# Altium footprint library Radio Lib.PcbLib: 41 footprints (part 1 of 3)
Each footprint in its own frame and in the unit in brackets; x right, y up, seen from the top. Pads: shape width x height; smd on the part's side, far side on the other; paste and mask are expansions set on the pad; w line width, h text height; cw(c..) or ccw(c..) is an arc to the next point about the centre after c.
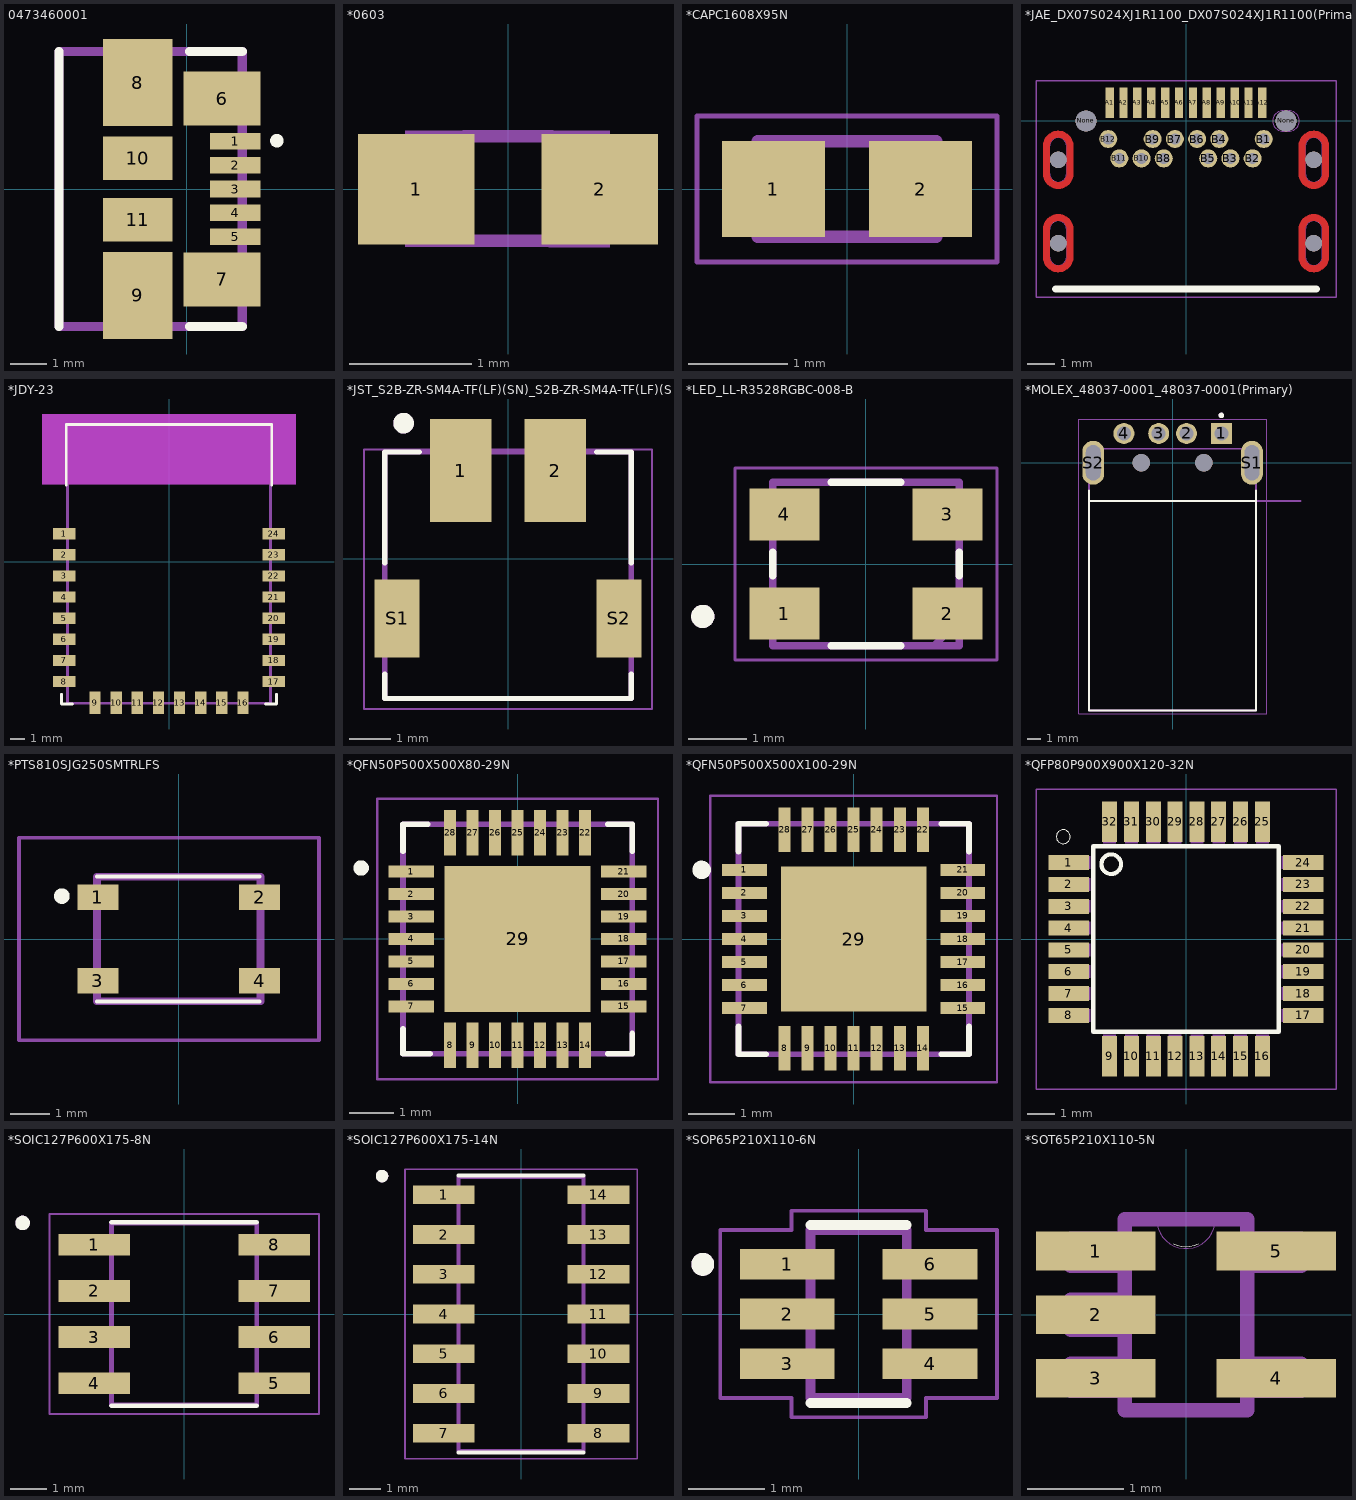
[diagram p0: the footprints below, top view; thin cyan lines are the x and y axes]

## 0473460001 [mm]
pads (11):
  rect 1.38x0.45 smd: 1(1.33,1.3) 2(1.33,0.65) 3(1.33,0) 4(1.33,-0.65) 5(1.33,-1.3)
  rect 2.1x1.475 smd: 6(0.97,2.462) 7(0.97,-2.462)
  rect 1.9x2.375 smd: 8(-1.33,2.903) 9(-1.33,-2.903)
  rect 1.9x1.175 smd: 10(-1.33,0.837) 11(-1.33,-0.837)
Top Overlay:
  circle w0.254: c2.46,1.317 r0.057
  lines w0.254: -3.48,-3.75 -3.48,3.75 ; 0.076,-3.75 1.52,-3.75 ; 0.076,3.75 1.52,3.75
Mechanical 4:
  lines w0.254: -3.48,-3.75 1.52,-3.75 1.52,3.75 -3.48,3.75 -3.48,-3.75
3D body "473460001.STEP": height 2.73, standoff -0.22, extent -3.449,-4.015 1.981,3.965

## *0603 [mm]
pads (2):
  rect 0.95x0.9 smd: 1(-0.75,0) 2(0.75,0)
Mechanical 4:
  region: -0.84,0.48 -0.338,0.48 -0.338,-0.471 -0.84,-0.471
  region: 0.331,0.48 0.83,0.48 0.83,-0.471 0.331,-0.471
  region: -0.84,0.48 -0.338,0.48 -0.338,-0.471 -0.84,-0.471
  region: 0.331,0.48 0.83,0.48 0.83,-0.471 0.331,-0.471
  lines w0.102: -0.356,-0.419 0.356,-0.419 -0.356,-0.419 ; -0.356,0.432 0.356,0.432 -0.356,0.432
3D body "LED SMD 0603.step": height 0.6, standoff 0, extent -0.8,-0.4 0.8,0.4

## *CAPC1608X95N [mm]
pads (2):
  rect 1.04x0.97 smd: 1(-0.74,0) 2(0.74,0)
Mechanical 4:
  lines w0.127: -0.9,-0.48 -0.9,0.48 ; -0.9,-0.48 0.9,-0.48 ; -0.9,-0.48 -0.9,0.48 ; -0.9,-0.48 0.9,-0.48 ; -0.9,0.48 0.9,0.48 ; -0.9,0.48 0.9,0.48 ; 0.9,-0.48 0.9,0.48 ; 0.9,-0.48 0.9,0.48
Mechanical 16:
  lines w0.05: -1.51,-0.737 -1.51,0.737 1.51,0.737 1.51,-0.737 -1.51,-0.737
3D body "CAPC-0603-T0.9-BN.stp": height 0.9, standoff 0, extent -0.85,-0.45 0.85,0.45

## *JAE_DX07S024XJ1R1100_DX07S024XJ1R1100(Primary) [mm]
pads (30):
  rect 0.3x1.1 smd: A1(-2.75,0.66) A2(-2.25,0.66) A3(-1.75,0.66) A4(-1.25,0.66) A5(-0.75,0.66) A6(-0.25,0.66) A7(0.25,0.66) A8(0.75,0.66) A9(1.25,0.66) A10(1.75,0.66) A11(2.25,0.66) A12(2.75,0.66)
  round 0.65 hole 0.4: B1(2.8,-0.65) B2(2.4,-1.35) B3(1.6,-1.35) B4(1.2,-0.65) B5(0.8,-1.35) B6(0.4,-0.65) B7(-0.4,-0.65) B8(-0.8,-1.35) B9(-1.2,-0.65) B10(-1.6,-1.35) B11(-2.4,-1.35) B12(-2.8,-0.65)
  round 0.6 hole 0.6 unplated: None(-4.6,-4.4) None(-4.6,-1.4) None(4.6,-4.4) None(4.6,-1.4)
  round 0.75 hole 0.75 unplated: None(-3.6,0) None(3.6,0)
Top Layer:
  lines w0.25: -5.025,-4.9 ccw(c-4.6,-4.9) -4.6,-5.325 ccw(c-4.6,-4.9) -4.175,-4.9 -4.175,-3.9 ccw(c-4.6,-3.9) -4.6,-3.475 ccw(c-4.6,-3.9) -5.025,-3.9 -5.025,-4.9 ; -5.025,-1.9 ccw(c-4.6,-1.9) -4.6,-2.325 ccw(c-4.6,-1.9) -4.175,-1.9 -4.175,-0.9 ccw(c-4.6,-0.9) -4.6,-0.475 ccw(c-4.6,-0.9) -5.025,-0.9 -5.025,-1.9 ; 4.175,-4.9 ccw(c4.6,-4.9) 4.6,-5.325 ccw(c4.6,-4.9) 5.025,-4.9 5.025,-3.9 ccw(c4.6,-3.9) 4.6,-3.475 ccw(c4.6,-3.9) 4.175,-3.9 4.175,-4.9 ; 4.175,-1.9 ccw(c4.6,-1.9) 4.6,-2.325 ccw(c4.6,-1.9) 5.025,-1.9 5.025,-0.9 ccw(c4.6,-0.9) 4.6,-0.475 ccw(c4.6,-0.9) 4.175,-0.9 4.175,-1.9
Top Overlay:
  lines w0.254: -4.7,-6.05 4.7,-6.05
Top Paste:
  lines w0.25: -5.025,-4.9 ccw(c-4.6,-4.9) -4.6,-5.325 ccw(c-4.6,-4.9) -4.175,-4.9 -4.175,-3.9 ccw(c-4.6,-3.9) -4.6,-3.475 ccw(c-4.6,-3.9) -5.025,-3.9 -5.025,-4.9 ; -5.025,-1.9 ccw(c-4.6,-1.9) -4.6,-2.325 ccw(c-4.6,-1.9) -4.175,-1.9 -4.175,-0.9 ccw(c-4.6,-0.9) -4.6,-0.475 ccw(c-4.6,-0.9) -5.025,-0.9 -5.025,-1.9 ; 4.175,-4.9 ccw(c4.6,-4.9) 4.6,-5.325 ccw(c4.6,-4.9) 5.025,-4.9 5.025,-3.9 ccw(c4.6,-3.9) 4.6,-3.475 ccw(c4.6,-3.9) 4.175,-3.9 4.175,-4.9 ; 4.175,-1.9 ccw(c4.6,-1.9) 4.6,-2.325 ccw(c4.6,-1.9) 5.025,-1.9 5.025,-0.9 ccw(c4.6,-0.9) 4.6,-0.475 ccw(c4.6,-0.9) 4.175,-0.9 4.175,-1.9
Top Solder:
  drawing of 4 lines, arcs and shapes, not listed
Bottom Solder:
  drawing of 4 lines, arcs and shapes, not listed
Mechanical 1:
  lines w0: -4.9,-4.9 ccw(c-4.6,-4.9) -4.6,-5.2 ccw(c-4.6,-4.9) -4.3,-4.9 -4.3,-3.9 ccw(c-4.6,-3.9) -4.6,-3.6 ccw(c-4.6,-3.9) -4.9,-3.9 -4.9,-4.9 ; -4.9,-1.9 ccw(c-4.6,-1.9) -4.6,-2.2 ccw(c-4.6,-1.9) -4.3,-1.9 -4.3,-0.9 ccw(c-4.6,-0.9) -4.6,-0.6 ccw(c-4.6,-0.9) -4.9,-0.9 -4.9,-1.9 ; 3.125,0 cw(c3.5,0) 3.5,0.375 3.7,0.375 cw(c3.7,0) 4.075,0 cw(c3.7,0) 3.7,-0.375 3.5,-0.375 cw(c3.5,0) 3.125,0 ; 4.3,-4.9 ccw(c4.6,-4.9) 4.6,-5.2 ccw(c4.6,-4.9) 4.9,-4.9 4.9,-3.9 ccw(c4.6,-3.9) 4.6,-3.6 ccw(c4.6,-3.9) 4.3,-3.9 4.3,-4.9 ; 4.3,-1.9 ccw(c4.6,-1.9) 4.6,-2.2 ccw(c4.6,-1.9) 4.9,-1.9 4.9,-0.9 ccw(c4.6,-0.9) 4.6,-0.6 ccw(c4.6,-0.9) 4.3,-0.9 4.3,-1.9
Mechanical 16:
  lines w0.05: -5.4,-6.35 -5.4,1.45 5.4,1.45 5.4,-6.35 -5.4,-6.35
3D body "DX07S024XJ1R1100--3DModel-STEP-56544.STEP": height 3.45, standoff -0.66, extent -4.7,-8.871 4.7,0.889

## *JDY-23 [mm]
pads (24):
  rect 1.6x0.8 smd: 1(-7.45,2) 2(-7.45,0.5) 3(-7.45,-1) 4(-7.45,-2.5) 5(-7.45,-4) 6(-7.45,-5.5) 7(-7.45,-7) 8(-7.45,-8.5) 17(7.45,-8.5) 18(7.45,-7) 19(7.45,-5.5) 20(7.45,-4) 21(7.45,-2.5) 22(7.45,-1) 23(7.45,0.5) 24(7.45,2)
  rect 0.8x1.6 smd: 9(-5.25,-10) 10(-3.75,-10) 11(-2.25,-10) 12(-0.75,-10) 13(0.75,-10) 14(2.25,-10) 15(3.75,-10) 16(5.25,-10)
Top Overlay:
  lines w0.203: -7.62,-9.398 -7.62,-10.1 -6.858,-10.1 ; -7.3,5.45 -7.3,9.75 7.3,9.75 7.3,5.45 ; 6.858,-10.1 7.62,-10.1 7.62,-9.398
Keep-Out Layer:
  region: -9,10.5 9,10.5 9,5.5 -9,5.5
  region: -9,10.5 9,10.5 9,5.5 -9,5.5
  region: -9,10.5 9,10.5 9,5.5 -9,5.5
  region: -9,10.5 9,10.5 9,5.5 -9,5.5
  region: -9,10.5 9,10.5 9,5.5 -9,5.5
  region: -9,10.5 9,10.5 9,5.5 -9,5.5
  region: -9,10.5 9,10.5 9,5.5 -9,5.5
  region: -9,10.5 9,10.5 9,5.5 -9,5.5
  region: -9,10.5 9,10.5 9,5.5 -9,5.5
Mechanical 4:
  region: -9,10.5 9,10.5 9,5.5 -9,5.5
  region: -9,10.5 9,10.5 9,5.5 -9,5.5
  lines w0.203: -7.2,-10.033 7.2,-10.033 ; -7.2,-10.033 -7.2,9.65 ; -7.2,-10.033 7.2,-10.033 ; -7.2,-10.033 -7.2,9.65 ; -7.2,9.65 7.2,9.65 ; -7.2,9.65 7.2,9.65 ; 7.2,-10.033 7.2,9.65 ; 7.2,-10.033 7.2,9.65
Mechanical 16:
  region: -9,10.5 9,10.5 9,5.5 -9,5.5
3D body "JDY-08.stp": height 2.08, standoff 0, extent -7.506,-10 7.506,9.888

## *JST_S2B-ZR-SM4A-TF(LF)(SN)_S2B-ZR-SM4A-TF(LF)(SN)(Primary) [mm]
pads (4):
  rect 1.5x2.5 smd: 1(-1.15,2.15) 2(1.15,2.15)
  rect 1.1x1.9 smd: S1(-2.7,-1.45) S2(2.7,-1.45)
Top Overlay:
  circle w0.3: c-2.54,3.302 r0.1
  lines w0.127: -3,-2.8 -3,-3.4 3,-3.4 3,-2.8 ; -3,-0.1 -3,2.6 -2.159,2.6 ; 2.159,2.6 3,2.6 3,-0.1
Mechanical 4:
  circle w0.3: c-2.54,3.302 r0.1
  circle w0.3: c-2.54,3.302 r0.1
  lines w0.127: -3,-3.4 3,-3.4 ; -3,-3.4 -3,2.6 ; -3,-3.4 3,-3.4 ; -3,-3.4 -3,2.6 ; -3,2.6 3,2.6 ; -3,2.6 3,2.6 ; 3,-3.4 3,2.6 ; 3,-3.4 3,2.6
Mechanical 16:
  lines w0.05: -3.5,-3.65 3.5,-3.65 3.5,2.667 -3.5,2.667 -3.5,-3.65
3D body "S2B-ZR-SM4A-TF(LF)(SN)--3DModel-STEP-56544.STEP": height 3.7, standoff 0, extent -3,-3.429 3,3.071

## *LED_LL-R3528RGBC-008-B [mm]
pads (4):
  rect 1.2x0.9 smd: 1(-1.4,-0.85) 2(1.4,-0.85) 3(1.4,0.85) 4(-1.4,0.85)
Top Overlay:
  circle w0.2: c-2.8,-0.9 r0.1
  lines w0.127: -1.6,-0.2 -1.6,0.2 ; -0.6,-1.4 0.6,-1.4 ; -0.6,1.4 0.6,1.4 ; 1.6,-0.2 1.6,0.2
Mechanical 4:
  circle w0.2: c-2.8,-0.9 r0.1
  circle w0.2: c-2.8,-0.9 r0.1
  lines w0.127: -1.6,-1.4 -1.6,1.4 ; -1.6,-1.4 1.17,-1.4 ; -1.6,-1.4 -1.6,1.4 ; -1.6,-1.4 1.17,-1.4 ; -1.6,1.4 1.6,1.4 ; -1.6,1.4 1.6,1.4 ; 1.17,-1.4 1.6,-1.4 ; 1.17,-1.4 1.6,-0.96 ; 1.17,-1.4 1.6,-1.4 ; 1.17,-1.4 1.6,-0.96 ; 1.6,-1.4 1.6,-0.96 ; 1.6,-1.4 1.6,-0.96 ; 1.6,-0.96 1.6,1.4 ; 1.6,-0.96 1.6,1.4
Mechanical 16:
  lines w0.05: -2.25,-1.65 -2.25,1.65 2.25,1.65 2.25,-1.65 -2.25,-1.65
3D body "LL-R3528RGBC-008-B--3DModel-STEP-56544.STEP": height 2.07, standoff -0.03, extent -1.75,-1.4 1.75,1.4

## *MOLEX_48037-0001_48037-0001(Primary) [mm]
pads (8):
  rect 1.508x1.508 hole 1: 1(3.5,2.1)
  round 1.508 hole 1: 2(1,2.1) 3(-1,2.1) 4(-3.5,2.1)
  round 1.25 hole 1.25 unplated: None(-2.25,0) None(2.25,0)
  oval 1.575x3.15 hole 1.05 slot 2.54 at 90 deg: S1(5.7,0) S2(-5.7,0)
Top Overlay:
  circle w0.2: c3.5,3.4 r0.1
  lines w0.127: -6,-2 -6,-2.75 ; 6,-2 6,-2.75 ; -6,-2.75 6,-2.75 ; -6,-2.75 -6,-17.8 6,-17.8 6,-2.75
Mechanical 1:
  lines w0: -6.225,-0.775 ccw(c-5.7,-0.775) -5.175,-0.775 -5.175,0.775 ccw(c-5.7,0.775) -6.225,0.775 -6.225,-0.775 ; 5.175,-0.775 ccw(c5.7,-0.775) 6.225,-0.775 6.225,0.775 ccw(c5.7,0.775) 5.175,0.775 5.175,-0.775
Mechanical 4:
  circle w0.2: c3.5,3.4 r0.1
  circle w0.2: c3.5,3.4 r0.1
  lines w0.127: -6,-17.8 -6,-2.75 ; -6,-17.8 6,-17.8 ; -6,-17.8 -6,-2.75 ; -6,-17.8 6,-17.8 ; -6,-2.75 -6,1 ; -6,-2.75 6,-2.75 ; -6,-2.75 -6,1 ; -6,-2.75 6,-2.75 ; -6,1 6,1 ; -6,1 6,1 ; 6,-17.8 6,-2.75 ; 6,-17.8 6,-2.75 ; 6,-2.75 6,1 ; 6,-2.75 9.2,-2.75 6,-2.75 ; 6,-2.75 6,1
  text "PCB EDGE" at 6.28,-2.72 h1.88
  text "PCB EDGE" at 6.28,-2.72 h1.88
Mechanical 16:
  lines w0.05: -6.75,-18.05 -6.75,3.11 6.75,3.11 6.75,-18.05 -6.75,-18.05
3D body "USB-A Right Angle Solder Plug.stp": height 3.4, standoff -2.62, extent -6.348,-17.749 6.348,2.286

## *PTS810SJG250SMTRLFS [mm]
pads (4):
  rect 1.05x0.65 smd: 1(-2.075,1.075) 2(2.075,1.075) 3(-2.075,-1.075) 4(2.075,-1.075)
Top Overlay:
  lines w0.1: -2.1,-1.6 2.075,-1.6 ; -2.1,1.6 2.075,1.6
  lines w0.2: -3,1 cw(c-3,1.1) -3,1.2 cw(c-3,1.1) -3,1
Mechanical 4:
  lines w0.1: -4.1,-2.6 -4.1,2.6 ; -4.1,-2.6 3.6,-2.6 ; -4.1,-2.6 -4.1,2.6 ; -4.1,-2.6 3.6,-2.6 ; -4.1,2.6 3.6,2.6 ; -4.1,2.6 3.6,2.6 ; 3.6,-2.6 3.6,2.6 ; 3.6,-2.6 3.6,2.6
  lines w0.2: -2.1,-1.6 -2.1,1.6 ; -2.1,-1.6 2.1,-1.6 ; -2.1,-1.6 -2.1,1.6 ; -2.1,-1.6 2.1,-1.6 ; -2.1,1.6 2.1,1.6 ; -2.1,1.6 2.1,1.6 ; 2.1,-1.6 2.1,1.6 ; 2.1,-1.6 2.1,1.6
3D body "c-147873-2-k-3d.stp": height 4.48, standoff -0.02, extent -3.4,-1.75 3.4,1.75

## *QFN50P500X500X80-29N [mm]
pads (29):
  rect 1.01x0.27 smd: 1(-2.36,1.5) 2(-2.36,1) 3(-2.36,0.5) 4(-2.36,0) 5(-2.36,-0.5) 6(-2.36,-1) 7(-2.36,-1.5) 15(2.36,-1.5) 16(2.36,-1) 17(2.36,-0.5) 18(2.36,0) 19(2.36,0.5) 20(2.36,1) 21(2.36,1.5)
  rect 0.27x1.01 smd: 8(-1.5,-2.36) 9(-1,-2.36) 10(-0.5,-2.36) 11(0,-2.36) 12(0.5,-2.36) 13(1,-2.36) 14(1.5,-2.36) 22(1.5,2.36) 23(1,2.36) 24(0.5,2.36) 25(0,2.36) 26(-0.5,2.36) 27(-1,2.36) 28(-1.5,2.36)
  rect 3.25x3.25 smd: 29(0,0)
Top Overlay:
  circle w0.2: c-3.478,1.578 r0.07
  lines w0.127: -2.55,-2 -2.55,-2.55 -1.95,-2.55 ; -2.55,1.95 -2.55,2.55 -2,2.55 ; 2,-2.55 2.55,-2.55 2.55,-2.1 ; 2,2.55 2.55,2.55 2.55,1.95
Top Paste:
  region: 0.18,1.33 1.33,1.33 1.33,0.18 0.18,0.18
  region: -1.332,1.33 -0.18,1.33 -0.18,0.18 -1.332,0.18
  region: -1.331,-0.18 -0.18,-0.18 -0.18,-1.331 -1.331,-1.331
  region: 0.18,-0.18 1.33,-0.18 1.33,-1.332 0.18,-1.332
Mechanical 4:
  lines w0.127: -2.55,-2.55 2.55,-2.55 ; -2.55,-2.55 -2.55,2.55 ; -2.55,-2.55 2.55,-2.55 ; -2.55,-2.55 -2.55,2.55 ; -2.55,2.55 2.55,2.55 ; -2.55,2.55 2.55,2.55 ; 2.55,-2.55 2.55,2.55 ; 2.55,-2.55 2.55,2.55
Mechanical 16:
  lines w0.05: -3.12,-3.12 3.12,-3.12 3.12,3.12 -3.12,3.12 -3.12,-3.12
3D body "CP2102N-A01-GQFN28--3DModel-STEP-56544.STEP": height 0.78, standoff -0.02, extent -2.5,-2.5 2.5,2.5

## *QFN50P500X500X100-29N [mm]
pads (29):
  rect 0.97x0.26 smd: 1(-2.37,1.5) 2(-2.37,1) 3(-2.37,0.5) 4(-2.37,0) 5(-2.37,-0.5) 6(-2.37,-1) 7(-2.37,-1.5) 15(2.37,-1.5) 16(2.37,-1) 17(2.37,-0.5) 18(2.37,0) 19(2.37,0.5) 20(2.37,1) 21(2.37,1.5)
  rect 0.26x0.97 smd: 8(-1.5,-2.37) 9(-1,-2.37) 10(-0.5,-2.37) 11(0,-2.37) 12(0.5,-2.37) 13(1,-2.37) 14(1.5,-2.37) 22(1.5,2.37) 23(1,2.37) 24(0.5,2.37) 25(0,2.37) 26(-0.5,2.37) 27(-1,2.37) 28(-1.5,2.37)
  rect 3.15x3.15 smd: 29(0,0)
Top Overlay:
  circle w0.2: c-3.3,1.5 r0.1
  lines w0.127: -2.5,-1.9 -2.5,-2.5 -1.9,-2.5 ; -2.5,1.9 -2.5,2.5 -1.9,2.5 ; 1.9,-2.5 2.5,-2.5 2.5,-1.9 ; 1.9,2.5 2.5,2.5 2.5,1.9
Top Paste:
  region: -0.991,0.989 0.989,0.989 0.989,-0.991 -0.991,-0.991
Mechanical 4:
  lines w0.127: -2.5,-2.5 -2.5,2.5 ; -2.5,-2.5 2.5,-2.5 ; -2.5,-2.5 -2.5,2.5 ; -2.5,-2.5 2.5,-2.5 ; -2.5,2.5 2.5,2.5 ; -2.5,2.5 2.5,2.5 ; 2.5,-2.5 2.5,2.5 ; 2.5,-2.5 2.5,2.5
Mechanical 16:
  lines w0.05: -3.11,-3.11 -3.11,3.11 3.11,3.11 3.11,-3.11 -3.11,-3.11
3D body "CP2102N-A01-GQFN28--3DModel-STEP-56544.STEP": height 0.79, standoff -0.01, extent -2.5,-2.5 2.5,2.5

## *QFP80P900X900X120-32N [mm]
pads (32):
  rect 1.5x0.55 smd: 1(-4.3,2.8) 2(-4.3,2) 3(-4.3,1.2) 4(-4.3,0.4) 5(-4.3,-0.4) 6(-4.3,-1.2) 7(-4.3,-2) 8(-4.3,-2.8) 17(4.3,-2.8) 18(4.3,-2) 19(4.3,-1.2) 20(4.3,-0.4) 21(4.3,0.4) 22(4.3,1.2) 23(4.3,2) 24(4.3,2.8)
  rect 0.55x1.5 smd: 9(-2.8,-4.3) 10(-2,-4.3) 11(-1.2,-4.3) 12(-0.4,-4.3) 13(0.4,-4.3) 14(1.2,-4.3) 15(2,-4.3) 16(2.8,-4.3) 25(2.8,4.3) 26(2,4.3) 27(1.2,4.3) 28(0.4,4.3) 29(-0.4,4.3) 30(-1.2,4.3) 31(-2,4.3) 32(-2.8,4.3)
Top Overlay:
  circle w0: c-4.5,3.75 r0.254
  circle w0.152: c-2.743,2.743 r0.359
  lines w0.152: -3.4,-3.4 -3.4,3.4 3.4,3.4 3.4,-3.4 -3.4,-3.4
Mechanical 4:
  drawing of 64 lines, arcs and shapes, not listed
Mechanical 16:
  lines w0.05: -5.5,-5.5 -5.5,5.5 5.5,5.5 5.5,-5.5 -5.5,-5.5
3D body "ATmega_AP214.STEP": height 1, standoff -0.1, extent -4.498,-4.498 4.498,4.498

## *SOIC127P600X175-8N [mm]
pads (8):
  rect 1.97x0.6 smd: 1(-2.475,1.905) 2(-2.475,0.635) 3(-2.475,-0.635) 4(-2.475,-1.905) 5(2.475,-1.905) 6(2.475,-0.635) 7(2.475,0.635) 8(2.475,1.905)
Top Overlay:
  circle w0.2: c-4.445,2.505 r0.1
  lines w0.127: -2,-2.525 2,-2.525 ; -2,2.525 2,2.525
Mechanical 4:
  circle w0.2: c-4.445,2.505 r0.1
  circle w0.2: c-4.445,2.505 r0.1
  lines w0.127: -2,-2.5 -2,2.5 ; -2,-2.5 2,-2.5 ; -2,-2.5 -2,2.5 ; -2,-2.5 2,-2.5 ; -2,2.5 2,2.5 ; -2,2.5 2,2.5 ; 2,-2.5 2,2.5 ; 2,-2.5 2,2.5
Mechanical 16:
  lines w0.05: -3.71,-2.75 -3.71,2.75 3.71,2.75 3.71,-2.75 -3.71,-2.75
3D body "S08.stp": height 1.55, standoff 0, extent -2.873,-2.45 3.127,2.45

## *SOIC127P600X175-14N [mm]
pads (14):
  rect 1.97x0.6 smd: 1(-2.475,3.81) 2(-2.475,2.54) 3(-2.475,1.27) 4(-2.475,0) 5(-2.475,-1.27) 6(-2.475,-2.54) 7(-2.475,-3.81) 8(2.475,-3.81) 9(2.475,-2.54) 10(2.475,-1.27) 11(2.475,0) 12(2.475,1.27) 13(2.475,2.54) 14(2.475,3.81)
Top Overlay:
  circle w0.2: c-4.445,4.41 r0.1
  lines w0.127: -2,-4.43 2,-4.43 ; -2,4.43 2,4.43
Mechanical 4:
  circle w0.2: c-4.445,4.41 r0.1
  circle w0.2: c-4.445,4.41 r0.1
  lines w0.127: -2,-4.375 -2,4.375 ; -2,-4.375 2,-4.375 ; -2,-4.375 -2,4.375 ; -2,-4.375 2,-4.375 ; -2,4.375 2,4.375 ; -2,4.375 2,4.375 ; 2,-4.375 2,4.375 ; 2,-4.375 2,4.375
Mechanical 16:
  lines w0.05: -3.71,-4.625 -3.71,4.625 3.71,4.625 3.71,-4.625 -3.71,-4.625
3D body "soic-14.stp": height 1.59, standoff -0.01, extent -3.022,-4.318 3.023,4.318

## *SOP65P210X110-6N [mm]
pads (6):
  rect 1.24x0.4 smd: 1(-0.935,0.65) 2(-0.935,0) 3(-0.935,-0.65) 4(0.935,-0.65) 5(0.935,0) 6(0.935,0.65)
Top Overlay:
  circle w0.15: c-2.04,0.65 r0.075
  lines w0.127: -0.63,-1.164 0.63,-1.164 ; -0.63,1.164 0.63,1.164
Mechanical 4:
  circle w0.15: c-2.04,0.65 r0.075
  circle w0.15: c-2.04,0.65 r0.075
  lines w0.127: -0.63,-1.1 -0.63,1.1 ; -0.63,-1.1 0.63,-1.1 ; -0.63,-1.1 -0.63,1.1 ; -0.63,-1.1 0.63,-1.1 ; -0.63,1.1 0.63,1.1 ; -0.63,1.1 0.63,1.1 ; 0.63,-1.1 0.63,1.1 ; 0.63,-1.1 0.63,1.1
Mechanical 16:
  lines w0.05: -1.81,-1.1 -0.88,-1.1 -0.88,-1.35 0.88,-1.35 0.88,-1.1 1.81,-1.1 1.81,1.1 0.88,1.1 0.88,1.35 -0.88,1.35 -0.88,1.1 -1.81,1.1 -1.81,-1.1
3D body "74LVC1G3157GW,125--3DModel-STEP-56544.STEP": height 1.09, standoff -0.01, extent -1.05,-1 1.05,1

## *SOT65P210X110-5N [mm]
pads (5):
  rect 1.24x0.4 smd: 1(-0.935,0.66) 2(-0.935,0) 3(-0.935,-0.66) 4(0.935,-0.66) 5(0.935,0.66)
Top Overlay:
  lines w0: -0.129,0.738 ccw(c0,0.991) 0.125,0.736
Mechanical 4:
  lines w0: -0.305,0.991 ccw(c0,0.991) 0.305,0.991 cw(c0,0.991) -0.305,0.991
  lines w0.152: -1.194,-0.787 -1.194,-0.508 ; -1.194,-0.787 -0.635,-0.787 ; -1.194,-0.787 -1.194,-0.508 ; -1.194,-0.787 -0.635,-0.787 ; -1.194,-0.508 -0.635,-0.508 ; -1.194,-0.508 -0.635,-0.508 ; -1.194,-0.152 -1.194,0.152 ; -1.194,-0.152 -0.635,-0.152 ; -1.194,-0.152 -1.194,0.152 ; -1.194,-0.152 -0.635,-0.152 ; -1.194,0.152 -0.635,0.152 ; -1.194,0.152 -0.635,0.152 ; -1.194,0.508 -1.194,0.787 ; -1.194,0.508 -0.635,0.508 ; -1.194,0.508 -1.194,0.787 ; -1.194,0.508 -0.635,0.508 ; -1.194,0.787 -0.635,0.787 ; -1.194,0.787 -0.635,0.787 ; -0.635,-0.991 0.635,-0.991 ; -0.635,-0.991 -0.635,-0.787 ; -0.635,-0.991 0.635,-0.991 ; -0.635,-0.991 -0.635,-0.787 ; -0.635,-0.787 -0.635,-0.508 ; -0.635,-0.787 -0.635,-0.508 ; -0.635,-0.508 -0.635,-0.152 ; -0.635,-0.508 -0.635,-0.152 ; -0.635,-0.152 -0.635,0.152 ; -0.635,-0.152 -0.635,0.152 ; -0.635,0.152 -0.635,0.508 ; -0.635,0.152 -0.635,0.508 ; -0.635,0.508 -0.635,0.787 ; -0.635,0.508 -0.635,0.787 ; -0.635,0.787 -0.635,0.991 ; -0.635,0.787 -0.635,0.991 ; -0.635,0.991 -0.305,0.991 ; -0.635,0.991 -0.305,0.991 ; -0.305,0.991 0.305,0.991 ; -0.305,0.991 0.305,0.991 ; 0.305,0.991 0.635,0.991 ; 0.305,0.991 0.635,0.991 ; 0.635,-0.991 0.635,-0.787 ; 0.635,-0.991 0.635,-0.787 ; 0.635,-0.787 0.635,-0.508 ; 0.635,-0.787 1.194,-0.787 ; 0.635,-0.787 0.635,-0.508 ; 0.635,-0.787 1.194,-0.787 ; 0.635,-0.508 0.635,0.508 ; 0.635,-0.508 1.194,-0.508 ; 0.635,-0.508 0.635,0.508 ; 0.635,-0.508 1.194,-0.508 ; 0.635,0.508 0.635,0.787 ; 0.635,0.508 1.194,0.508 ; 0.635,0.508 0.635,0.787 ; 0.635,0.508 1.194,0.508 ; 0.635,0.787 0.635,0.991 ; 0.635,0.787 1.194,0.787 ; 0.635,0.787 0.635,0.991 ; 0.635,0.787 1.194,0.787 ; 1.194,-0.787 1.194,-0.508 ; 1.194,-0.787 1.194,-0.508 ; 1.194,0.508 1.194,0.787 ; 1.194,0.508 1.194,0.787
3D body "sc705_model.STEP": height 0.92, standoff -0.03, extent -1.015,-1.006 1.085,0.994